# Altium footprint library MH_DA_THU_VIEN_16122016.PcbLib: 531 footprints (part 18 of 34)
Each footprint in its own frame and in the unit in brackets; x right, y up, seen from the top. Pads: shape width x height; smd on the part's side, far side on the other; paste and mask are expansions set on the pad; w line width, h text height; cw(c..) or ccw(c..) is an arc to the next point about the centre after c.
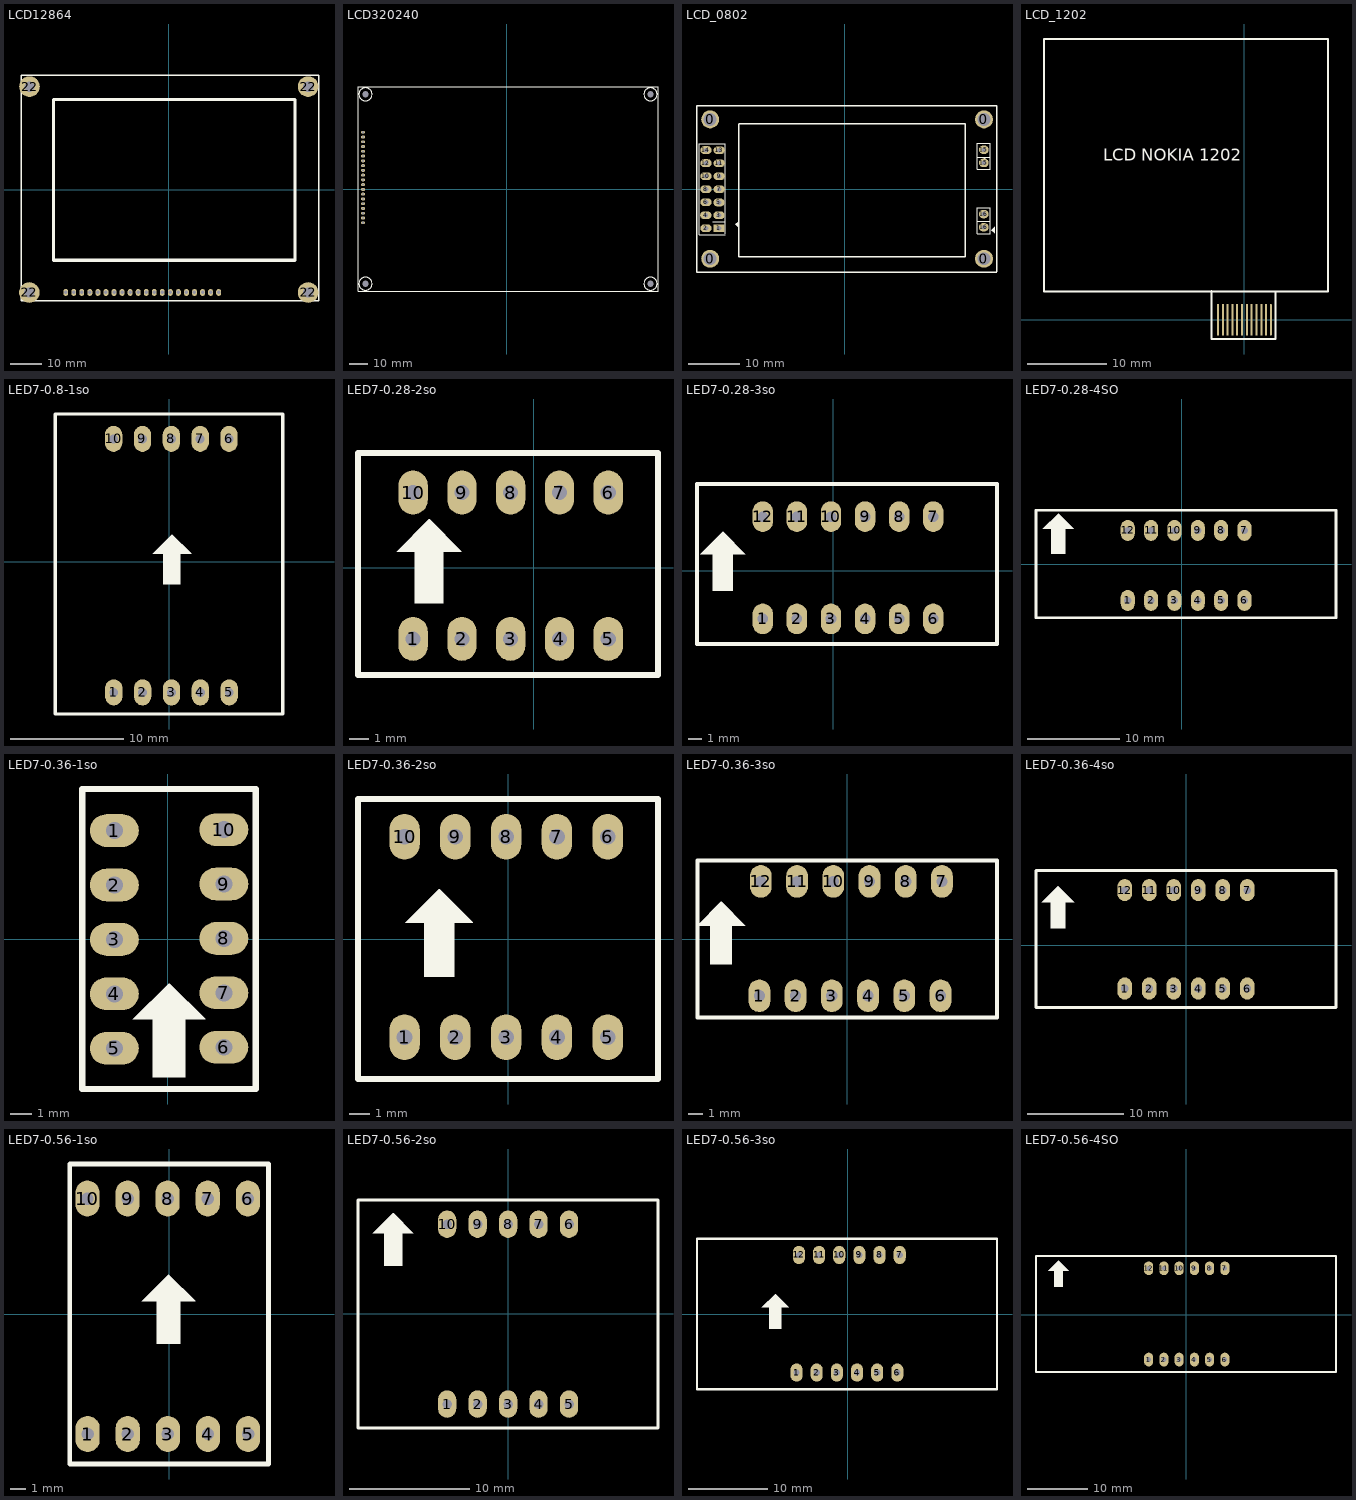
[diagram p17: the footprints below, top view; thin cyan lines are the x and y axes]

## LCD12864 [mm] "LCD12864"
pads (25):
  oval 1.524x2.159 hole 1.1: 1(15.76,-32.5) 1(15.76,-32.5) 2(13.22,-32.5) 3(10.68,-32.5) 4(8.14,-32.5) 5(5.6,-32.5) 6(3.06,-32.5) 7(0.52,-32.5) 8(-2.02,-32.5) 9(-4.56,-32.5) 10(-7.1,-32.5) 11(-9.64,-32.5) 12(-12.18,-32.5) 13(-14.72,-32.5) 14(-17.26,-32.5) 15(-19.8,-32.5) 16(-22.34,-32.5) 17(-24.88,-32.5) 18(-27.42,-32.5) 19(-29.96,-32.5) 20(-32.5,-32.5)
  round 6.5 hole 3.3: 22(-44,-32.5) 22(-43.93,32.5) 22(44,-32.5) 22(44,32.5)
Top Overlay:
  lines w0.45: -46.54,-35.04 -46.54,36.08 47.44,36.08 47.44,-35.04 -46.54,-35.04
  lines w1: -36.38,-22.34 39.82,-22.34 39.82,28.46 -36.38,28.46 -36.38,-22.34

## LCD320240 [mm]
pads (24):
  round 0 hole 3.3: 0(-75.35,-50.5) 0(-75.35,50.5) 0(76.65,-50.5) 0(76.65,50.5)
  oval 2.159x1.524 hole 1.1: 1(-76.65,-18) 2(-76.65,-15.46) 3(-76.65,-12.92) 4(-76.65,-10.38) 5(-76.65,-7.84) 6(-76.65,-5.3) 7(-76.65,-2.76) 8(-76.65,-0.22) 9(-76.65,2.32) 10(-76.65,4.86) 11(-76.65,7.4) 12(-76.65,9.94) 13(-76.65,12.48) 14(-76.65,15.02) 15(-76.65,17.56) 16(-76.65,20.1) 17(-76.65,22.64) 18(-76.65,25.18) 19(-76.65,27.72) 20(-76.65,30.26)
Top Overlay:
  circle w0.254: c-75.35,50.5 r3.5
  circle w0.254: c-75.35,-50.5 r3.5
  circle w0.254: c76.65,-50.5 r3.5
  circle w0.254: c76.65,50.5 r3.5
  lines w0.254: -79.35,-54.5 -79.35,54.5 80.65,54.5 80.65,-54.5 -79.35,-54.5

## LCD_0802 [mil]
pads (22):
  round 137.8 hole 98.43: 0(-1034.25,-535) 0(-1034.25,535) 0(1067.75,-535) 0(1067.75,535)
  rect 86x60 hole 36 square: 1(-966.75,-301.5)
  oval 86x60 hole 36: 2(-1066.25,-301) 3(-966.75,-201.5) 4(-1067.75,-200.5) 5(-966.75,-102.5) 6(-1066.25,-101) 7(-964.75,-1.5) 8(-1066.25,-1) 9(-964.75,98.5) 10(-1066.25,99) 11(-964.75,198.5) 12(-1066.25,199) 13(-964.75,298.5) 14(-1066.25,299)
  oval 75x65 hole 36: 15(1066.75,201) 15(1066.75,302) 16(1065.75,-293) 16(1065.75,-192)
Top Overlay:
  region: -841.25,-272 -816.25,-297 -816.25,-247
  region: 1052.75,219 1077.75,194 1077.75,244
  region: 1124.75,-316 1149.75,-341 1149.75,-291
  lines w7: -1015.25,-251 -917.25,-251 ; -916.75,-351.5 -1016.75,-351.5 -1116.75,-351.5 -1116.75,349 -916.75,349 -916.75,-341.5 ; 1016.75,-248 1115.75,-248 ; 1017.75,246 1116.75,246 ; 1015.75,-343 1115.75,-343 1115.75,-143 1015.75,-143 1015.75,-343 ; 1016.75,151 1116.75,151 1116.75,351 1016.75,351 1016.75,151
  lines w10: -1135.25,-639 1167.9,-639 ; -1135.25,-637 -1135.25,640 1167.75,640 1167.75,-635 ; -813.25,502.62 -813.25,-517 -812.25,-518 924.75,-518 924.75,502 -809.55,502
3D body: height 335.25, standoff -117.51, extent -1116.26,-350.99 -916.26,349.01
3D body: height 323.44, standoff -117.51, extent 1018.32,152.97 1116.75,349.03
3D body: height 323.44, standoff -117.51, extent 1017.32,-341.03 1115.75,-144.97
3D body: height 342.52, standoff -167.32, extent -1135.25,-632.84 1148.21,627

## LCD_1202 [mil]
pads (12):
  oval 10x157.48 smd: 1(132,0)
  rect 10x157.48 smd: 2(108,0) 3(84,0) 4(60,0) 5(36,0) 6(12,0) 7(-12,0) 8(-36,0) 9(-60,0) 10(-84,0) 11(-108,0) 12(-132,0)
Top Overlay:
  lines w10: -164.08,143.56 -164.08,-96.44 155.92,-96.44 155.92,133.56 ; -1000.32,141.26 -1000.32,1401.1 417,1401.1 417,141.26 -1000.32,141.26
  text "LCD NOKIA 1202" at -704.08,793.56 h60
3D body: height 130.52, standoff 0.6, extent -1009.97,-97.29 407.35,1400.92

## LED7-0.8-1so [mil]
pads (10):
  oval 60x90 hole 31: 1(-191.34,-452.76) 2(-91.34,-452.76) 3(8.66,-452.76) 4(108.66,-452.76) 5(208.66,-452.76) 6(208.12,425.65) 7(108.12,425.65) 8(8.12,425.65) 9(-91.88,425.65) 10(-191.88,425.65)
Top Overlay:
  region: -56.63,27.56 9.37,93.56 11.37,93.56 76.37,28.56 76.37,27.56 39.37,27.56 39.37,-78.44 -19.63,-78.44 -19.63,27.56
  lines w11.81: -393.7,511.81 -393.7,-377.95 -393.7,-527.56 -236.22,-527.56 259.84,-527.56 393.7,-527.56 393.7,-405.51 393.7,342.52 393.7,511.81 259.84,511.81 -389.76,511.81

## LED7-0.28-2so [mil]
pads (10):
  oval 60x90 hole 31: 1(-247,-146) 2(-147,-146) 3(-47,-146) 4(53,-146) 5(153,-146) 6(153,154) 7(53,154) 8(-47,154) 9(-147,154) 10(-247,154)
Top Overlay:
  region: -281,33 -215,99 -213,99 -148,34 -148,33 -185,33 -185,-73 -244,-73 -244,33
  lines w11.81: -360,-220 255,-220 255,235 -360,235 -360,-220

## LED7-0.28-3so [mil]
pads (12):
  oval 60x90 hole 31: 1(-207,-141) 2(-107,-141) 3(-7,-141) 4(93,-141) 5(193,-141) 6(293,-141) 7(293,159) 8(193,159) 9(93,159) 10(-7,159) 11(-107,159) 12(-207,159)
Top Overlay:
  region: -391,48 -325,114 -323,114 -258,49 -258,48 -295,48 -295,-58 -354,-58 -354,48
  lines w11.81: -400,-215 480,-215 480,255 -400,255 -400,-215

## LED7-0.28-4SO [mil]
pads (12):
  oval 60x90 hole 31: 1(-232,-156) 2(-132,-156) 3(-32,-156) 4(68,-156) 5(168,-156) 6(268,-156) 7(268,144) 8(168,144) 9(68,144) 10(-32,144) 11(-132,144) 12(-232,144)
Top Overlay:
  region: -596,150 -530,216 -528,216 -463,151 -463,150 -500,150 -500,44 -559,44 -559,150
  lines w11.81: -625,-230 -625,230 660,230 660,-230 -625,-230
3D body: height 276.19, standoff -117.51, extent -282,-200.99 318,-100.99
3D body: height 276.19, standoff -117.51, extent -287,94 313,194

## LED7-0.36-1so [mil]
pads (10):
  oval 90x60 hole 31: 1(-98.43,199.21) 2(-98.43,99.21) 3(-98.43,-0.79) 4(-98.43,-100.79) 5(-98.43,-200.79) 6(102.69,-198.97) 7(102.69,-98.97) 8(102.69,1.03) 9(102.69,101.03) 10(102.69,201.03)
Top Overlay:
  region: -64.5,-147.79 1.5,-81.79 3.5,-81.79 68.5,-146.79 68.5,-147.79 31.5,-147.79 31.5,-253.79 -27.5,-253.79 -27.5,-147.79
  lines w11.81: -157.48,-275.59 161.42,-275.59 161.42,275.59 -157.48,275.59 -157.48,-275.59
3D body: height 314.96, standoff -177.17, extent -143.7,-279.53 151.58,271.65

## LED7-0.36-2so [mil]
pads (10):
  oval 60x90 hole 31: 1(-203.69,-193.24) 2(-103.69,-193.24) 3(-3.69,-193.24) 4(96.31,-193.24) 5(196.31,-193.24) 6(196.31,201.24) 7(96.31,201.24) 8(-3.69,201.24) 9(-103.69,201.24) 10(-203.69,201.24)
Top Overlay:
  region: -202.3,31.5 -136.3,97.5 -134.3,97.5 -69.3,32.5 -69.3,31.5 -106.3,31.5 -106.3,-74.5 -165.3,-74.5 -165.3,31.5
  lines w11.81: -295.28,-275.59 -295.28,275.59 295.28,275.59 295.28,-275.59 -295.28,-275.59

## LED7-0.36-3so [mil]
pads (12):
  oval 60x90 hole 31: 1(-242.43,-156.75) 2(-142.43,-156.75) 3(-42.43,-156.75) 4(57.57,-156.75) 5(157.57,-156.75) 6(257.57,-156.75) 7(261.5,159) 8(161.5,159) 9(61.5,159) 10(-38.5,159) 11(-138.5,159) 12(-238.5,159)
Top Overlay:
  region: -414.62,36.19 -348.62,102.19 -346.62,102.19 -281.62,37.19 -281.62,36.19 -318.62,36.19 -318.62,-69.81 -377.62,-69.81 -377.62,36.19
  lines w11.81: -413.39,-216.54 413.39,-216.54 413.39,216.54 -413.39,216.54 -413.39,-216.54
3D body: height 276.19, standoff -117.51, extent -293.5,109 306.5,209
3D body: height 276.19, standoff -117.51, extent -292.43,-201.74 307.57,-101.74

## LED7-0.36-4so [mil]
pads (12):
  oval 60x90 hole 31: 1(-251.97,-177.17) 2(-151.97,-177.17) 3(-51.97,-177.17) 4(48.03,-177.17) 5(148.03,-177.17) 6(248.03,-177.17) 7(248.03,224.41) 8(148.03,224.41) 9(48.03,224.41) 10(-51.97,224.41) 11(-151.97,224.41) 12(-251.97,224.41)
Top Overlay:
  region: -591,175 -525,241 -523,241 -458,176 -458,175 -495,175 -495,69 -554,69 -554,175
  lines w11.81: -614.17,-255 -614.17,305 610.24,305 610.24,-255 -614.17,-255
3D body: height 283.86, standoff -263.78, extent -590.54,-244.09 590.56,307.09

## LED7-0.56-1so [mil]
pads (10):
  oval 60x90 hole 31: 1(-203.15,-299.21) 2(-103.15,-299.21) 3(-3.15,-299.21) 4(96.85,-299.21) 5(196.85,-299.21) 6(196.31,287.86) 7(96.31,287.86) 8(-3.69,287.86) 9(-103.69,287.86) 10(-203.69,287.86)
Top Overlay:
  region: -68.44,31.5 -2.44,97.5 -0.44,97.5 64.56,32.5 64.56,31.5 27.56,31.5 27.56,-74.5 -31.44,-74.5 -31.44,31.5
  lines w11.81: -248.03,-374.02 -248.03,374.02 248.03,374.02 248.03,-374.02 -248.03,-374.02
3D body: height 316.25, standoff -156.19, extent -249.91,-382.03 250.09,367.97

## LED7-0.56-2so [mil]
pads (10):
  oval 60x90 hole 31: 1(-200,-296) 2(-100,-296) 3(0,-296) 4(100,-296) 5(200,-296) 6(200,294) 7(100,294) 8(0,294) 9(-100,294) 10(-200,294)
Top Overlay:
  region: -444,264 -378,330 -376,330 -311,265 -311,264 -348,264 -348,158 -407,158 -407,264
  lines w10: -492.5,-374.62 -492.5,373.41 491.75,373.41 491.75,-374.62 -492.5,-374.62

## LED7-0.56-3so [mil]
pads (12):
  oval 60x90 hole 31: 1(-254.24,-290.61) 2(-154.24,-290.61) 3(-54.24,-290.61) 4(45.76,-290.61) 5(145.76,-290.61) 6(245.76,-290.61) 7(257.57,292.86) 8(157.57,292.86) 9(57.57,292.86) 10(-42.43,292.86) 11(-142.43,292.86) 12(-242.43,292.86)
Top Overlay:
  region: -426.43,32.25 -360.43,98.25 -358.43,98.25 -293.43,33.25 -293.43,32.25 -330.43,32.25 -330.43,-73.75 -389.43,-73.75 -389.43,32.25
  lines w11.81: -748.03,-374.02 -748.03,374.02 740.16,374.02 740.16,-374.02 -748.03,-374.02
3D body: height 276.19, standoff -117.51, extent -297.43,242.86 302.57,342.86
3D body: height 276.19, standoff -117.51, extent -304.24,-335.6 295.76,-235.6
3D body: height 511.81, standoff 35.43, extent -744.09,-381.89 736.22,366.14

## LED7-0.56-4SO [mil]
pads (12):
  oval 60x90 hole 31: 1(-245,-293.94) 2(-145,-293.94) 3(-45,-293.94) 4(55,-293.94) 5(155,-293.94) 6(255,-293.94) 7(255,305) 8(155,305) 9(55,305) 10(-45,305) 11(-145,305) 12(-245,305)
Top Overlay:
  region: -903.14,289.22 -837.14,355.22 -835.14,355.22 -770.14,290.22 -770.14,289.22 -807.14,289.22 -807.14,183.22 -866.14,183.22 -866.14,289.22
  lines w11.81: -984.25,-375 984.25,-375 984.25,385 -984.25,385 -984.25,-375
3D body: height 276.19, standoff -117.51, extent -300,255 300,355
3D body: height 276.19, standoff -117.51, extent -295,-348.94 305,-248.94
3D body: height 564.96, standoff 112.2, extent -993.09,-356.29 987.23,391.75